# Altium footprint library 接插件封装库.PcbLib: 112 footprints (part 7 of 7)
Each footprint in its own frame and in the unit in brackets; x right, y up, seen from the top. Pads: shape width x height; smd on the part's side, far side on the other; paste and mask are expansions set on the pad; w line width, h text height; cw(c..) or ccw(c..) is an arc to the next point about the centre after c.
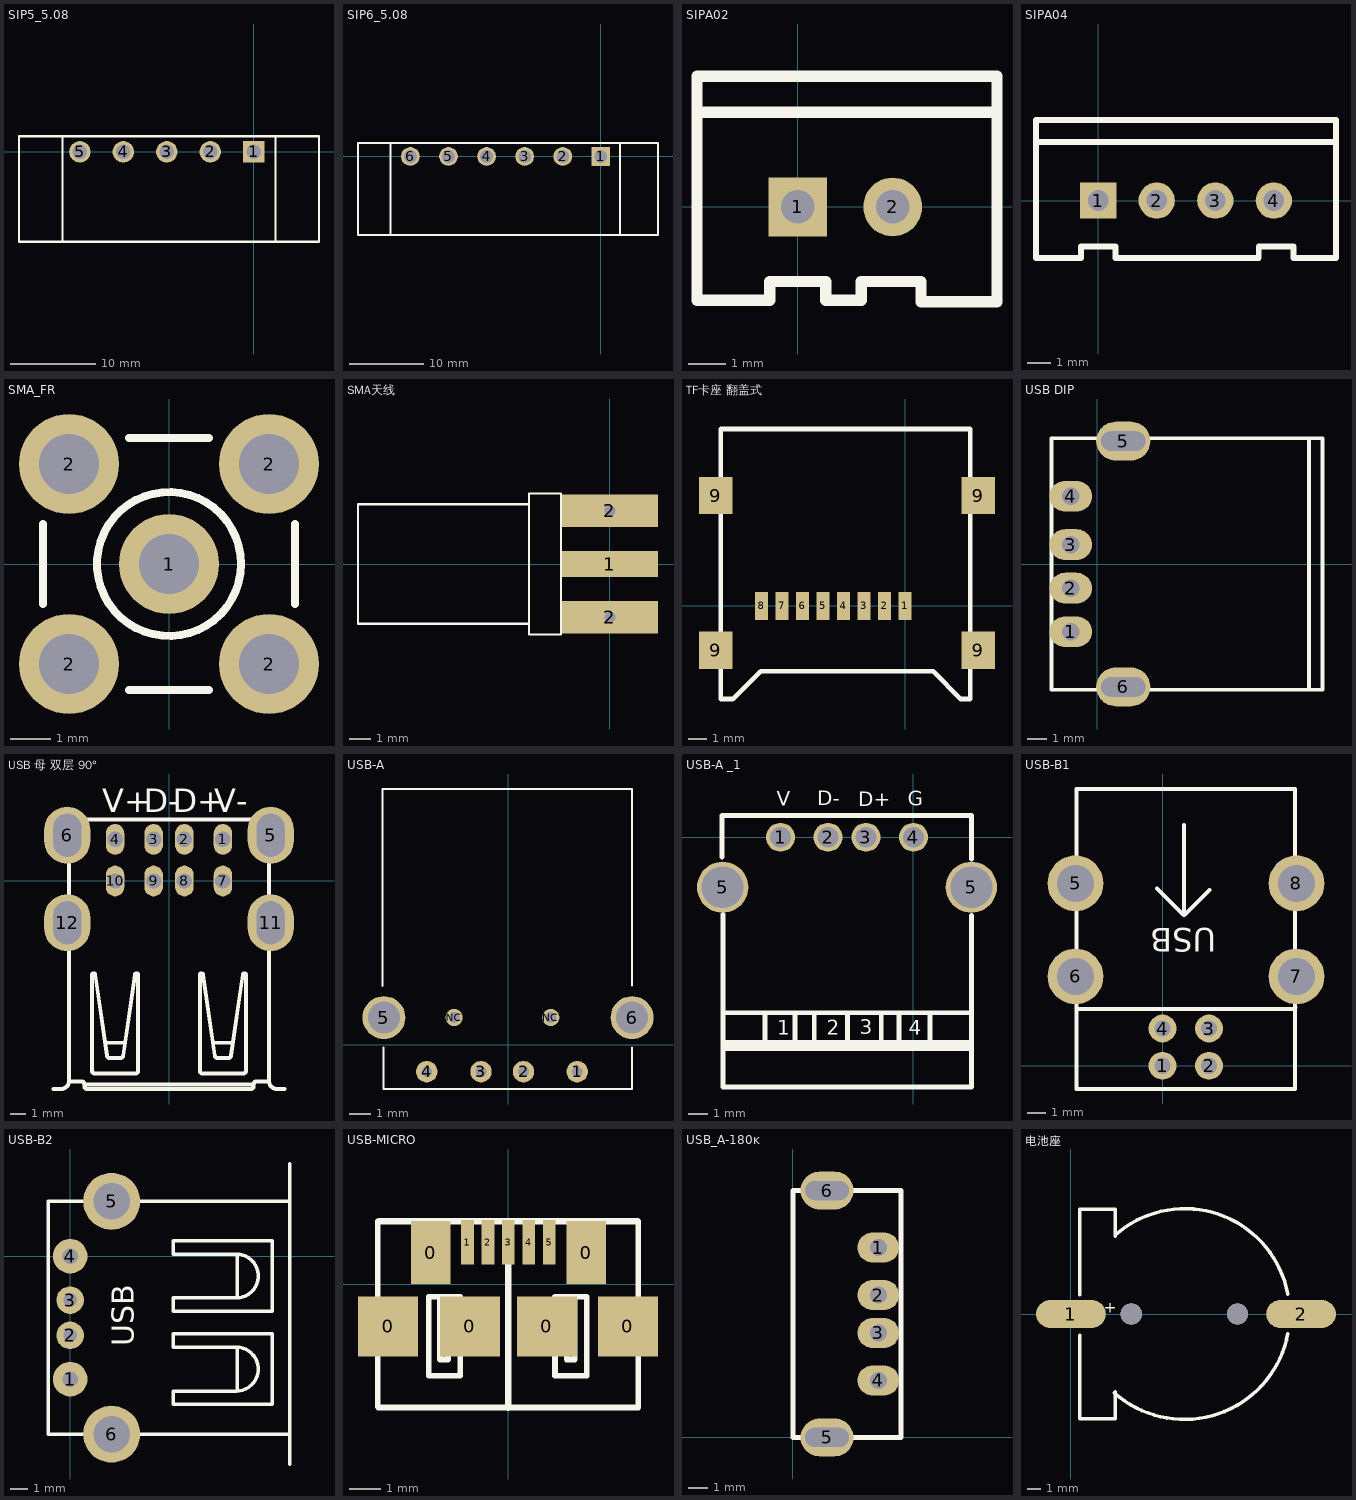
[diagram p6: the footprints below, top view; thin cyan lines are the x and y axes]

## SIP5_5.08 [mm]
pads (5):
  rect 2.5x2.5 hole 1.7: 1(0,0)
  round 2.5 hole 1.7: 2(-5.08,0) 3(-10.16,0) 4(-15.24,0) 5(-20.32,0)
Top Overlay:
  lines w0.254: -27.432,-10.5 7.62,-10.5 7.62,1.819 -0.051,1.819 ; -27.432,-10.414 -27.432,1.819 0,1.819 ; -22.352,-10.414 -22.352,1.778 ; 2.54,-10.5 2.54,1.819

## SIP6_5.08 [mm]
pads (6):
  rect 2.5x2.5 hole 1.7: 1(0,0)
  round 2.5 hole 1.7: 2(-5.08,0) 3(-10.16,0) 4(-15.24,0) 5(-20.32,0) 6(-25.4,0)
Top Overlay:
  lines w0.254: -28.067,-10.414 -28.067,1.778 ; -0.051,1.819 7.62,1.819 7.62,-10.5 -32.385,-10.5 -32.385,1.819 0,1.819 ; 2.54,-10.5 2.54,1.819

## SIPA02 [mil]
pads (2):
  rect 62x62 hole 35.43: 1(0,0)
  round 62 hole 35.43: 2(100,0)
Top Overlay:
  lines w11.81: -106.3,-98.42 -29.53,-98.42 -29.53,-78.74 29.53,-78.74 29.53,-98.42 66.93,-98.42 ; 70.87,-78.74 66.93,-82.68 66.93,-86.61 66.93,-98.42 ; 210,-100 129.92,-100 129.92,-78.74 66.93,-78.74 66.93,-98.42
  lines w12: -106.3,-98.42 -106.3,137.79 210,137.79 ; -106.3,100 204.49,100 ; 210,-100 210,136.22
3D body: height 279.53, standoff -129.92, extent -95.66,-92.51 195.67,133.87

## SIPA04 [mil]
pads (4):
  rect 62x62 hole 35.43: 1(0,0)
  round 62 hole 35.43: 2(100,0) 3(200,0) 4(300,0)
Top Overlay:
  lines w10: -102.48,100 -6.3,100 404.72,100 ; 404.72,137.79 -6.3,137.79 -106.3,137.79 -106.3,-98.42 -29.53,-98.42 -29.53,-78.74 29.53,-78.74 29.53,-98.42 174.41,-98.42 274.41,-98.42 274.41,-78.74 333.46,-78.74 333.46,-98.42 406.3,-98.42 406.3,137.79
3D body: height 279.53, standoff -129.92, extent -94.09,-92.36 394.1,134.02

## SMA_FR [mm]
height 8
pads (5):
  round 2.5 hole 1.5: 1(0,0) 2(-2.5,-2.5) 2(-2.5,2.5) 2(2.5,-2.5) 2(2.5,2.5)
Top Overlay:
  circle w0.2: c0,0 r1.8
  lines w0.2: -3.15,-1 -3.15,1 ; -1,-3.15 1,-3.15 ; -1,3.15 1,3.15 ; 3.15,-1 3.15,1
Mechanical 1:
  circle w0.025: c0,0 r0.2
  circle w0.025: c0,0 r1.05
  circle w0.025: c0,0 r1.8
3D body: height 10.26, standoff -3.84, extent -3.5,-3.5 3.5,11.6

## SMA天线 [mm]
pads (3):
  rect 4.5x1.2 smd: 1(0,0)
  rect 4.5x1.524 hole 0.5: 2(0,-2.5) 2(0,2.5)
Top Overlay:
  lines w0.1: -3.8,-2.8 -11.8,-2.8 -11.8,2.8 -3.8,2.8 ; -3.8,-3.3 -2.3,-3.3 -2.3,3.3 -3.8,3.3 -3.8,-3.3
3D body: height 4.6, standoff -3.32, extent -12.489,-4.76 1.781,4.76
3D body: height 4.5, standoff -4.5, extent -26.543,-4.889 -8.293,41.973

## TF卡座 翻盖式 [mm]
height 2
pads (12):
  rect 0.7x1.5 smd: 1(0,0) 2(-1.1,0) 3(-2.2,0) 4(-3.3,0) 5(-4.4,0) 6(-5.5,0) 7(-6.6,0) 8(-7.7,0)
  rect 1.8x2 smd: 9(-10.168,-2.378) 9(-10.168,5.922) 9(3.932,-2.378) 9(3.932,5.922)
Top Overlay:
  lines w0.254: -9.9,-5 -9.9,9.5 0,9.5 3.5,9.5 3.5,-5 3,-5 1.5,-3.5 -7.75,-3.5 -9.25,-5 -9.9,-5
3D body: height 1.93, standoff -0.02, extent -10.5,-5 4.1,9.5

## USB DIP [mm]
pads (6):
  oval 2.2x1.6 hole 0.9: 1(-1.355,-3.5) 2(-1.355,-1.25) 3(-1.355,1) 4(-1.355,3.5)
  oval 2.8x2 hole 1 slot 2.3 at 0 deg: 5(1.355,6.35) 6(1.355,-6.35)
Top Overlay:
  lines w0.2: 10.945,-6.5 10.945,6.5 ; -2.355,-6.5 11.645,-6.5 11.645,6.5 -2.355,6.5 -2.355,-6.5

## USB 母 双层 90° [mm] "HW-UAF-25"
height 17
pads (12):
  oval 1.2x2 hole 1: 1(3.5,2.7) 2(1,2.7) 3(-1,2.7) 4(-3.5,2.7) 7(3.5,0) 8(1,0) 9(-1,0) 10(-3.5,0)
  oval 3x3.7 hole 1.8 slot 2.8 at 90 deg: 5(6.6,2.97) 6(-6.6,2.97) 11(6.6,-2.71) 12(-6.6,-2.71)
Top Overlay:
  lines w0.254: -7.5,-13.5 -7,-13.5 ccw(c-7,-13) -6.5,-13 ; -6.5,-4.3 -6.5,-13 ; -6.5,-1.3 -6.5,0.5 -6.5,4 ; -4.15,-10.5 -2.849,-10.5 ; 2.85,-10.5 4.151,-10.5 ; 6.5,-4.3 6.5,-13 ; 6.5,-1.3 6.5,0.5 6.5,4 ; 7.5,-13.5 7,-13.5 cw(c7,-13) 6.5,-13 ; -6.5,-13 -5.7,-13 cw(c-5.7,-13.2) -5.5,-13.2 ; -6.5,4 6.5,4 ; -6.5,4 -6.5,4 ; -5.5,-13.2 -5.5,-13.3 ccw(c-5.3,-13.3) -5.3,-13.5 5.3,-13.5 ccw(c5.3,-13.3) 5.5,-13.3 5.5,-13.2 ; -5.5,-13.2 5.5,-13.2 ; 5.5,-13.2 cw(c5.7,-13.2) 5.7,-13 6.5,-13 ; 6.5,4 6.5,4 ; -5,-12.3 ccw(c-4.8,-12.3) -4.8,-12.5 -2.2,-12.5 ccw(c-2.2,-12.3) -2,-12.3 -2,-6.1 ccw(c-2.1,-6.1) -2.1,-6 -2.113,-6 ccw(c-2.113,-6.1) -2.212,-6.086 -2.97,-11.336 cw(c-3.167,-11.3) -3.167,-11.5 -3.833,-11.5 cw(c-3.833,-11.3) -4.03,-11.336 -4.788,-6.086 ccw(c-4.887,-6.1) -4.887,-6 -4.9,-6 ccw(c-4.9,-6.1) -5,-6.1 -5,-12.3 ; 2,-12.3 ccw(c2.2,-12.3) 2.2,-12.5 4.8,-12.5 ccw(c4.8,-12.3) 5,-12.3 5,-6.1 ccw(c4.9,-6.1) 4.9,-6 4.887,-6 ccw(c4.887,-6.1) 4.788,-6.086 4.03,-11.336 cw(c3.833,-11.3) 3.833,-11.5 3.167,-11.5 cw(c3.167,-11.3) 2.97,-11.336 2.212,-6.086 ccw(c2.113,-6.1) 2.113,-6 2.1,-6 ccw(c2.1,-6.1) 2,-6.1 2,-12.3
  text "D-" at -1.651,4.445 h1.52
  text "D+" at 0.254,4.445 h1.52
  text "V-" at 2.921,4.445 h1.52
  text "V+" at -4.318,4.445 h1.52
3D body: height 16.43, standoff -4.07, extent -7.72,-13.539 7.72,4.826

## USB-A [mm]
pads (8):
  round 1 hole 0.5: 1(3.222,-1.26) 2(0.722,-1.26) 3(-1.258,-1.26) 4(-3.785,-1.26)
  round 2 hole 1.5: 5(-5.779,1.26) 6(5.779,1.26)
  round 0.8 hole 0.5: NC(-2.508,1.26) NC(1.992,1.26)
Top Overlay:
  lines w0.1: -5.842,2.733 -5.842,11.852 ; -5.842,11.903 5.766,11.903 5.778,2.759 ; -5.804,-0.14 -5.804,-2.067 5.779,-2.067 5.779,-0.14
3D body: height 0, standoff -2, extent 1.499,0.762 2.495,1.76
3D body: height 7.55, standoff -3.3, extent -8.128,-2.321 7.671,11.839
3D body: height 0, standoff -2, extent -2.997,0.762 -2.001,1.76

## USB-A _1 [mm]
pads (6):
  round 1.524 hole 1.1: 1(-7,0) 2(-4.5,0) 3(-2.5,0) 4(0,0)
  round 2.7 hole 2.2: 5(-10.05,-2.635) 5(3.05,-2.635)
Top Overlay:
  lines w0.254: -10.079,-1.041 -10.079,1.143 3.053,1.143 3.053,-1.143 3.053,0.356 ; -10.028,-9.246 3.053,-9.246 ; -10.028,-4.064 -10.028,-13.157 3.053,-13.157 3.053,-4.115 ; -10.002,-11.135 3.053,-11.135 ; -10.002,-10.922 3.053,-10.922 ; -9.875,-10.795 3.053,-10.795 ; -7.818,-10.795 -7.818,-9.246 ; -6.243,-10.795 -6.243,-9.322 ; -5.227,-10.82 -5.227,-9.271 ; -3.475,-10.795 -3.475,-9.322 ; -1.697,-10.897 -1.697,-9.271 ; -0.757,-10.871 -0.757,-9.271 ; 0.869,-10.998 0.869,-9.296
  text "D-" at -5.08,1.676 h0.76
  text "D+" at -2.896,1.626 h0.76
  text "4" at -0.254,-10.414 h0.76
  text "3" at -2.819,-10.389 h0.76
  text "2" at -4.572,-10.414 h0.76
  text "1" at -7.163,-10.414 h0.76
  text "G" at -0.305,1.651 h0.76
  text "V" at -7.188,1.651 h0.76
3D body: height 2.2, standoff -8.65, extent -11.202,-12.979 4.598,1.181

## USB-B1 [mil]
pads (8):
  round 60 hole 35: 1(0,0) 2(100,0) 3(100,80) 4(0,80)
  round 120 hole 80: 5(-187,392) 6(-187,192) 7(288,192) 8(288,392)
Top Overlay:
  lines w8: -185,122 285,122 286,126 ; -12,381 44,325 ; 46,324 46,518 ; 47,324 101,378 ; -185,-50 285,-50 285,595 -185,595 -185,-50
  text "USB" at 115,296 h50

## USB-B2 [mil]
pads (6):
  round 78.74 hole 35.43: 1(0,-280) 4(0,0)
  round 62.99 hole 31.5: 2(0,-180) 3(0,-100)
  round 129.92 hole 82.68: 5(94.49,125) 6(94.49,-405)
Top Overlay:
  lines w8: 380,-305 380,-209 ; 380,-93 380,3 ; 500,-473 500,210 ; 500,-405 -50,-405 -50,125 500,125 ; 235,-337 235,-307 378.79,-307 ccw(c378.26,-257) 378.79,-206.99 235,-207 235,-177 460,-177 460,-337 235,-337 ; 235,-125 235,-95 378.79,-95 ccw(c378.26,-44.99) 378.79,5.01 235,5 235,35 460,35 460,-125 235,-125
  text "USB" at 145,-205 h50

## USB-MICRO [mm]
pads (11):
  rect 1.9x1.9 smd: 0(-3.797,-1.333) 0(-1.206,-1.333) 0(1.232,-1.333) 0(3.797,-1.333)
  rect 1.25x2 smd: 0(-2.451,1.003) 0(2.476,1.003)
  rect 0.4x1.4 smd: 1(-1.283,1.333) 2(-0.635,1.333) 3(0.013,1.333) 4(0.66,1.333) 5(1.308,1.333)
Top Overlay:
  lines w0.178: -4.127,-3.873 -4.127,1.994 ; -4.102,-3.899 4.102,-3.899 ; -2.152,-0.394 -2.152,-2.379 -1.949,-2.379 -1.898,-2.379 -1.898,-0.394 ; 1.861,-0.394 1.861,-2.379 2.115,-2.379 2.115,-0.394 ; 4.127,-3.899 4.127,1.994 ; -2.513,-2.894 -1.513,-2.894 -1.513,-0.394 -2.513,-0.394 -2.513,-2.894 ; 1.487,-2.894 1.487,-0.394 2.487,-0.394 2.487,-2.894 1.487,-2.894
  lines w0.2: -4.077,1.994 4.102,1.994 ; 0.013,-3.91 0.013,1.968
3D body: height 2.77, standoff -0.17, extent -4.1,-3.912 4.1,2.018

## USB_A-180ĸ [mm]
height 13
pads (6):
  oval 2.2x1.6 hole 0.9: 1(4.5,10) 2(4.5,7.5) 3(4.5,5.5) 4(4.5,3)
  oval 2.8x2 hole 1 slot 2.3 at 0 deg: 5(1.8,0) 6(1.8,13)
Top Overlay:
  lines w0.254: 0,0 5.7,0 5.7,13 0,13 0,0

## 电池座 [mm]
height 5
pads (2):
  oval 5x2 smd: 1(0,0) 2(16.5,0)
via 4.318,0 diameter 1.524 hole 1.524
via 11.938,0 diameter 1.524 hole 1.524
Top Overlay:
  lines w0.254: 0.635,-1.524 0.635,-7.493 3.175,-7.493 3.175,-5.588 ; 0.635,1.397 0.635,7.493 3.175,7.493 3.175,5.588 ; 3.115,-5.655 ccw(c8.128,0) 15.553,-1.408 ; 3.175,5.659 cw(c8.159,0.035) 15.543,1.43
  text "+" at 3.302,0.762 h0.81
3D body: height 3.94, standoff -1, extent -1,-7.5 17.5,7.497